# Altium schematic symbol library MCU_Microchip_ATmega.SchLib: 440 symbols (part 1 of 7) (continued)
## ATmega48PV-10A (continued)
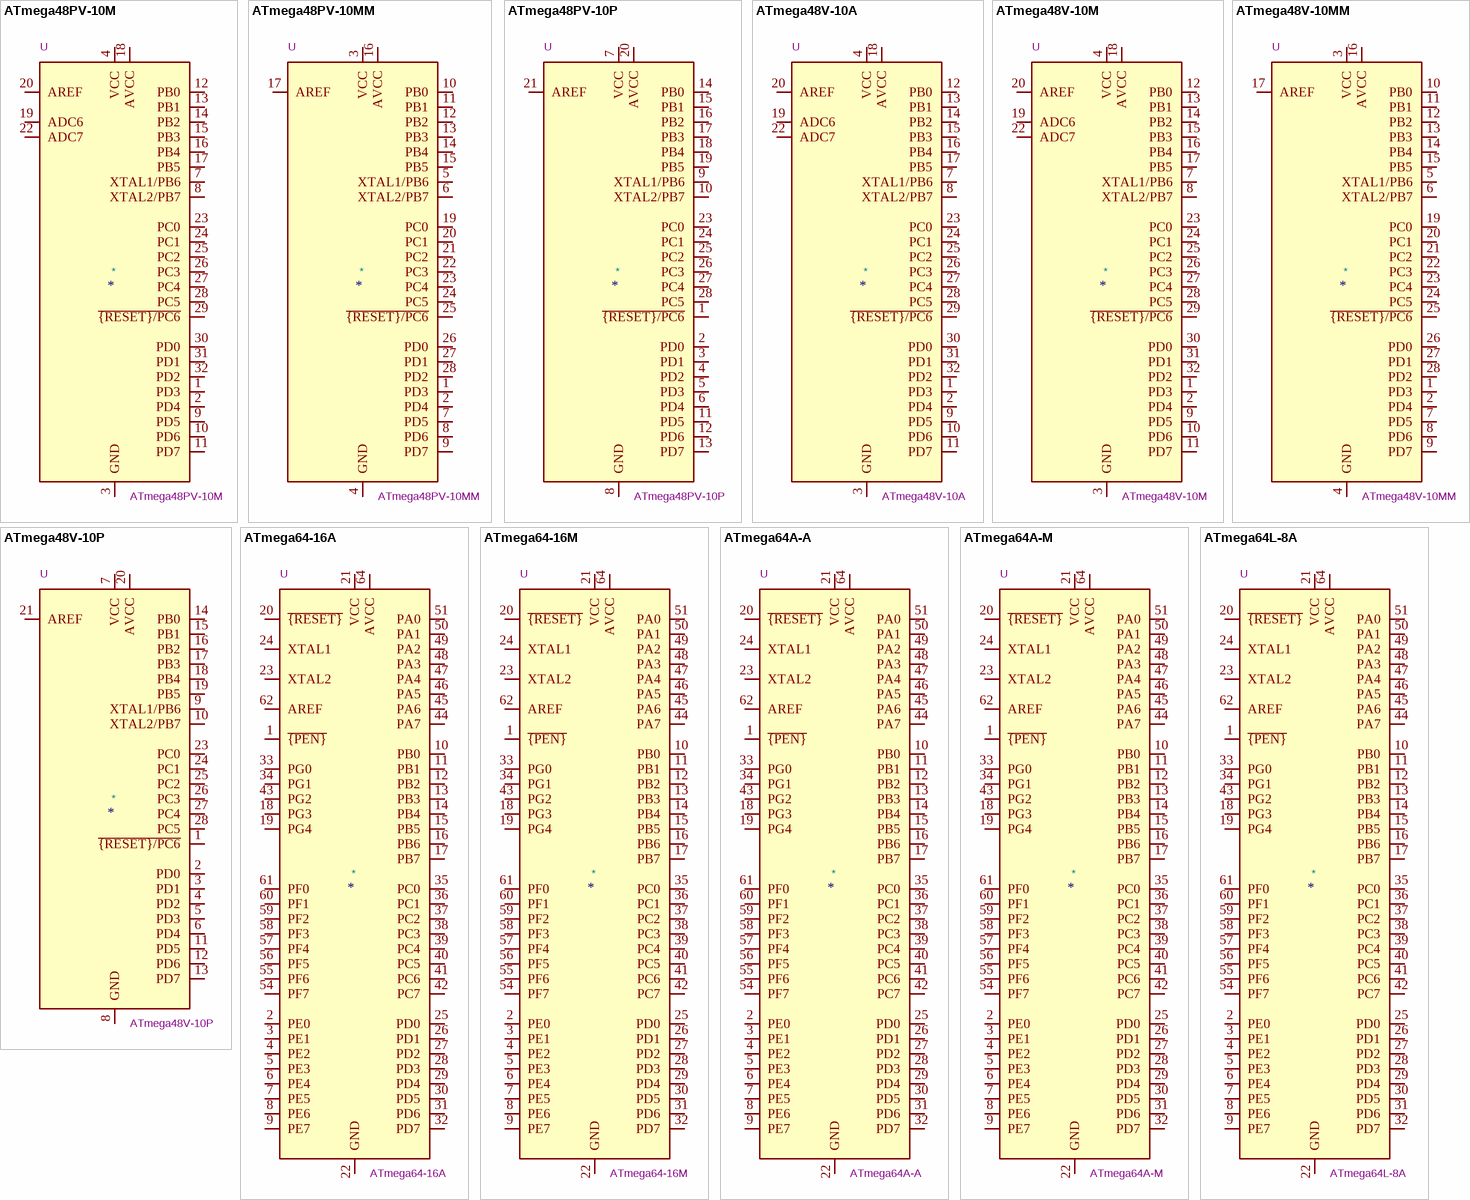
[diagram p5: symbols ATmega48PV-10M to ATmega64L-8A]

## ATmega48PV-10M
designator *  value ATmega48PV-10M  Reference: U
ki_keywords: AVR 8bit Microcontroller MegaAVR; ki_description: 10MHz, 4kB Flash, 512B SRAM, 256B EEPROM, QFN-32; ki_fp_filters: QFN*1EP*5x5mm*P0.5mm*; Footprint: Package_DFN_QFN:QFN-32-1EP_5x5mm_P0.5mm_EP3.1x3.1mm; Datasheet: http://ww1.microchip.com/downloads/en/DeviceDoc/Atmel-8025-8-bit-AVR-Microcontroller-ATmega48P-88P-168P_Datasheet.pdf
pins: 1 PD3, 2 PD4, 3 GND, 4 VCC, 5 GND hidden, 6 VCC hidden, 7 XTAL1/PB6, 8 XTAL2/PB7, 9 PD5, 10 PD6, 11 PD7, 12 PB0, 13 PB1, 14 PB2, 15 PB3, 16 PB4, 17 PB5, 18 AVCC, 19 ADC6, 20 AREF, 21 GND hidden, 22 ADC7, 23 PC0, 24 PC1, 25 PC2, 26 PC3, 27 PC4, 28 PC5, 29 ~{{RESET}/PC6}, 30 PD0, 31 PD1, 32 PD2, 33 GND hidden

## ATmega48PV-10MM
designator *  value ATmega48PV-10MM  Reference: U
ki_keywords: AVR 8bit Microcontroller MegaAVR; ki_description: 10MHz, 4kB Flash, 512B SRAM, 256B EEPROM, QFN-28; ki_fp_filters: QFN*1EP*4x4mm*P0.45mm*; Footprint: Package_DFN_QFN:QFN-28-1EP_4x4mm_P0.45mm_EP2.4x2.4mm; Datasheet: http://ww1.microchip.com/downloads/en/DeviceDoc/Atmel-8025-8-bit-AVR-Microcontroller-ATmega48P-88P-168P_Datasheet.pdf
pins: 1 PD3, 2 PD4, 3 VCC, 4 GND, 5 XTAL1/PB6, 6 XTAL2/PB7, 7 PD5, 8 PD6, 9 PD7, 10 PB0, 11 PB1, 12 PB2, 13 PB3, 14 PB4, 15 PB5, 16 AVCC, 17 AREF, 18 GND hidden, 19 PC0, 20 PC1, 21 PC2, 22 PC3, 23 PC4, 24 PC5, 25 ~{{RESET}/PC6}, 26 PD0, 27 PD1, 28 PD2, 29 GND hidden

## ATmega48PV-10P
designator *  value ATmega48PV-10P  Reference: U
ki_keywords: AVR 8bit Microcontroller MegaAVR; ki_description: 10MHz, 4kB Flash, 512B SRAM, 256B EEPROM, DIP-28; ki_fp_filters: DIP*W7.62mm*; Footprint: Package_DIP:DIP-28_W7.62mm; Datasheet: http://ww1.microchip.com/downloads/en/DeviceDoc/Atmel-8025-8-bit-AVR-Microcontroller-ATmega48P-88P-168P_Datasheet.pdf
pins: 1 ~{{RESET}/PC6}, 2 PD0, 3 PD1, 4 PD2, 5 PD3, 6 PD4, 7 VCC, 8 GND, 9 XTAL1/PB6, 10 XTAL2/PB7, 11 PD5, 12 PD6, 13 PD7, 14 PB0, 15 PB1, 16 PB2, 17 PB3, 18 PB4, 19 PB5, 20 AVCC, 21 AREF, 22 GND hidden, 23 PC0, 24 PC1, 25 PC2, 26 PC3, 27 PC4, 28 PC5

## ATmega48V-10A
designator *  value ATmega48V-10A  Reference: U
ki_keywords: AVR 8bit Microcontroller MegaAVR; ki_description: 10MHz, 4kB Flash, 512B SRAM, 256B EEPROM, TQFP-32; ki_fp_filters: TQFP*7x7mm*P0.8mm*; Footprint: Package_QFP:TQFP-32_7x7mm_P0.8mm; Datasheet: http://ww1.microchip.com/downloads/en/DeviceDoc/Atmel-2545-8-bit-AVR-Microcontroller-ATmega48-88-168_Datasheet.pdf
pins: 1 PD3, 2 PD4, 3 GND, 4 VCC, 5 GND hidden, 6 VCC hidden, 7 XTAL1/PB6, 8 XTAL2/PB7, 9 PD5, 10 PD6, 11 PD7, 12 PB0, 13 PB1, 14 PB2, 15 PB3, 16 PB4, 17 PB5, 18 AVCC, 19 ADC6, 20 AREF, 21 GND hidden, 22 ADC7, 23 PC0, 24 PC1, 25 PC2, 26 PC3, 27 PC4, 28 PC5, 29 ~{{RESET}/PC6}, 30 PD0, 31 PD1, 32 PD2

## ATmega48V-10M
designator *  value ATmega48V-10M  Reference: U
ki_keywords: AVR 8bit Microcontroller MegaAVR; ki_description: 10MHz, 4kB Flash, 512B SRAM, 256B EEPROM, QFN-32; ki_fp_filters: QFN*1EP*5x5mm*P0.5mm*; Footprint: Package_DFN_QFN:QFN-32-1EP_5x5mm_P0.5mm_EP3.1x3.1mm; Datasheet: http://ww1.microchip.com/downloads/en/DeviceDoc/Atmel-2545-8-bit-AVR-Microcontroller-ATmega48-88-168_Datasheet.pdf
pins: 1 PD3, 2 PD4, 3 GND, 4 VCC, 5 GND hidden, 6 VCC hidden, 7 XTAL1/PB6, 8 XTAL2/PB7, 9 PD5, 10 PD6, 11 PD7, 12 PB0, 13 PB1, 14 PB2, 15 PB3, 16 PB4, 17 PB5, 18 AVCC, 19 ADC6, 20 AREF, 21 GND hidden, 22 ADC7, 23 PC0, 24 PC1, 25 PC2, 26 PC3, 27 PC4, 28 PC5, 29 ~{{RESET}/PC6}, 30 PD0, 31 PD1, 32 PD2, 33 GND hidden

## ATmega48V-10MM
designator *  value ATmega48V-10MM  Reference: U
ki_keywords: AVR 8bit Microcontroller MegaAVR; ki_description: 10MHz, 4kB Flash, 512B SRAM, 256B EEPROM, QFN-28; ki_fp_filters: QFN*1EP*4x4mm*P0.45mm*; Footprint: Package_DFN_QFN:QFN-28-1EP_4x4mm_P0.45mm_EP2.4x2.4mm; Datasheet: http://ww1.microchip.com/downloads/en/DeviceDoc/Atmel-2545-8-bit-AVR-Microcontroller-ATmega48-88-168_Datasheet.pdf
pins: 1 PD3, 2 PD4, 3 VCC, 4 GND, 5 XTAL1/PB6, 6 XTAL2/PB7, 7 PD5, 8 PD6, 9 PD7, 10 PB0, 11 PB1, 12 PB2, 13 PB3, 14 PB4, 15 PB5, 16 AVCC, 17 AREF, 18 GND hidden, 19 PC0, 20 PC1, 21 PC2, 22 PC3, 23 PC4, 24 PC5, 25 ~{{RESET}/PC6}, 26 PD0, 27 PD1, 28 PD2, 29 GND hidden

## ATmega48V-10P
designator *  value ATmega48V-10P  Reference: U
ki_keywords: AVR 8bit Microcontroller MegaAVR; ki_description: 10MHz, 4kB Flash, 512B SRAM, 256B EEPROM, DIP-28; ki_fp_filters: DIP*W7.62mm*; Footprint: Package_DIP:DIP-28_W7.62mm; Datasheet: http://ww1.microchip.com/downloads/en/DeviceDoc/Atmel-2545-8-bit-AVR-Microcontroller-ATmega48-88-168_Datasheet.pdf
pins: 1 ~{{RESET}/PC6}, 2 PD0, 3 PD1, 4 PD2, 5 PD3, 6 PD4, 7 VCC, 8 GND, 9 XTAL1/PB6, 10 XTAL2/PB7, 11 PD5, 12 PD6, 13 PD7, 14 PB0, 15 PB1, 16 PB2, 17 PB3, 18 PB4, 19 PB5, 20 AVCC, 21 AREF, 22 GND hidden, 23 PC0, 24 PC1, 25 PC2, 26 PC3, 27 PC4, 28 PC5

## ATmega64-16A
designator *  value ATmega64-16A  Reference: U
ki_keywords: AVR 8bit Microcontroller MegaAVR; ki_description: 16MHz, 64kB Flash, 4kB SRAM, 2kB EEPROM, TQFP-64; ki_fp_filters: TQFP*14x14mm*P0.8mm*; Footprint: Package_QFP:TQFP-64_14x14mm_P0.8mm; Datasheet: http://ww1.microchip.com/downloads/en/DeviceDoc/atmel-2490-8-bit-avr-microcontroller-atmega64-l_datasheet.pdf
pins: 1 ~{{PEN}}, 2 PE0, 3 PE1, 4 PE2, 5 PE3, 6 PE4, 7 PE5, 8 PE6, 9 PE7, 10 PB0, 11 PB1, 12 PB2, 13 PB3, 14 PB4, 15 PB5, 16 PB6, 17 PB7, 18 PG3, 19 PG4, 20 ~{{RESET}}, 21 VCC, 22 GND, 23 XTAL2, 24 XTAL1, 25 PD0, 26 PD1, 27 PD2, 28 PD3, 29 PD4, 30 PD5, 31 PD6, 32 PD7, 33 PG0, 34 PG1, 35 PC0, 36 PC1, 37 PC2, 38 PC3, 39 PC4, 40 PC5, 41 PC6, 42 PC7, 43 PG2, 44 PA7, 45 PA6, 46 PA5, 47 PA4, 48 PA3, 49 PA2, 50 PA1, 51 PA0, 52 VCC hidden, 53 GND hidden, 54 PF7, 55 PF6, 56 PF5, 57 PF4, 58 PF3, 59 PF2, 60 PF1, 61 PF0, 62 AREF, 63 GND hidden, 64 AVCC

## ATmega64-16M
designator *  value ATmega64-16M  Reference: U
ki_keywords: AVR 8bit Microcontroller MegaAVR; ki_description: 16MHz, 64kB Flash, 4kB SRAM, 2kB EEPROM, QFN-64; ki_fp_filters: QFN*1EP*9x9mm*P0.5mm*; Footprint: Package_DFN_QFN:QFN-64-1EP_9x9mm_P0.5mm_EP5.4x5.4mm; Datasheet: http://ww1.microchip.com/downloads/en/DeviceDoc/atmel-2490-8-bit-avr-microcontroller-atmega64-l_datasheet.pdf
pins: 1 ~{{PEN}}, 2 PE0, 3 PE1, 4 PE2, 5 PE3, 6 PE4, 7 PE5, 8 PE6, 9 PE7, 10 PB0, 11 PB1, 12 PB2, 13 PB3, 14 PB4, 15 PB5, 16 PB6, 17 PB7, 18 PG3, 19 PG4, 20 ~{{RESET}}, 21 VCC, 22 GND, 23 XTAL2, 24 XTAL1, 25 PD0, 26 PD1, 27 PD2, 28 PD3, 29 PD4, 30 PD5, 31 PD6, 32 PD7, 33 PG0, 34 PG1, 35 PC0, 36 PC1, 37 PC2, 38 PC3, 39 PC4, 40 PC5, 41 PC6, 42 PC7, 43 PG2, 44 PA7, 45 PA6, 46 PA5, 47 PA4, 48 PA3, 49 PA2, 50 PA1, 51 PA0, 52 VCC hidden, 53 GND hidden, 54 PF7, 55 PF6, 56 PF5, 57 PF4, 58 PF3, 59 PF2, 60 PF1, 61 PF0, 62 AREF, 63 GND hidden, 64 AVCC, 65 GND hidden

## ATmega64A-A
designator *  value ATmega64A-A  Reference: U
ki_keywords: AVR 8bit Microcontroller MegaAVR; ki_description: 16MHz, 64kB Flash, 4kB SRAM, 2kB EEPROM, TQFP-64; ki_fp_filters: TQFP*14x14mm*P0.8mm*; Footprint: Package_QFP:TQFP-64_14x14mm_P0.8mm; Datasheet: http://ww1.microchip.com/downloads/en/DeviceDoc/atmel-8160-8-bit-avr-microcontroller-atmega64a-datasheet.pdf
pins: 1 ~{{PEN}}, 2 PE0, 3 PE1, 4 PE2, 5 PE3, 6 PE4, 7 PE5, 8 PE6, 9 PE7, 10 PB0, 11 PB1, 12 PB2, 13 PB3, 14 PB4, 15 PB5, 16 PB6, 17 PB7, 18 PG3, 19 PG4, 20 ~{{RESET}}, 21 VCC, 22 GND, 23 XTAL2, 24 XTAL1, 25 PD0, 26 PD1, 27 PD2, 28 PD3, 29 PD4, 30 PD5, 31 PD6, 32 PD7, 33 PG0, 34 PG1, 35 PC0, 36 PC1, 37 PC2, 38 PC3, 39 PC4, 40 PC5, 41 PC6, 42 PC7, 43 PG2, 44 PA7, 45 PA6, 46 PA5, 47 PA4, 48 PA3, 49 PA2, 50 PA1, 51 PA0, 52 VCC hidden, 53 GND hidden, 54 PF7, 55 PF6, 56 PF5, 57 PF4, 58 PF3, 59 PF2, 60 PF1, 61 PF0, 62 AREF, 63 GND hidden, 64 AVCC

## ATmega64A-M
designator *  value ATmega64A-M  Reference: U
ki_keywords: AVR 8bit Microcontroller MegaAVR; ki_description: 16MHz, 64kB Flash, 4kB SRAM, 2kB EEPROM, QFN-64; ki_fp_filters: QFN*1EP*9x9mm*P0.5mm*; Footprint: Package_DFN_QFN:QFN-64-1EP_9x9mm_P0.5mm_EP5.4x5.4mm; Datasheet: http://ww1.microchip.com/downloads/en/DeviceDoc/atmel-8160-8-bit-avr-microcontroller-atmega64a-datasheet.pdf
pins: 1 ~{{PEN}}, 2 PE0, 3 PE1, 4 PE2, 5 PE3, 6 PE4, 7 PE5, 8 PE6, 9 PE7, 10 PB0, 11 PB1, 12 PB2, 13 PB3, 14 PB4, 15 PB5, 16 PB6, 17 PB7, 18 PG3, 19 PG4, 20 ~{{RESET}}, 21 VCC, 22 GND, 23 XTAL2, 24 XTAL1, 25 PD0, 26 PD1, 27 PD2, 28 PD3, 29 PD4, 30 PD5, 31 PD6, 32 PD7, 33 PG0, 34 PG1, 35 PC0, 36 PC1, 37 PC2, 38 PC3, 39 PC4, 40 PC5, 41 PC6, 42 PC7, 43 PG2, 44 PA7, 45 PA6, 46 PA5, 47 PA4, 48 PA3, 49 PA2, 50 PA1, 51 PA0, 52 VCC hidden, 53 GND hidden, 54 PF7, 55 PF6, 56 PF5, 57 PF4, 58 PF3, 59 PF2, 60 PF1, 61 PF0, 62 AREF, 63 GND hidden, 64 AVCC, 65 GND hidden

## ATmega64L-8A
designator *  value ATmega64L-8A  Reference: U
ki_keywords: AVR 8bit Microcontroller MegaAVR; ki_description: 8MHz, 64kB Flash, 4kB SRAM, 2kB EEPROM, TQFP-64; ki_fp_filters: TQFP*14x14mm*P0.8mm*; Footprint: Package_QFP:TQFP-64_14x14mm_P0.8mm; Datasheet: http://ww1.microchip.com/downloads/en/DeviceDoc/atmel-2490-8-bit-avr-microcontroller-atmega64-l_datasheet.pdf
pins: 1 ~{{PEN}}, 2 PE0, 3 PE1, 4 PE2, 5 PE3, 6 PE4, 7 PE5, 8 PE6, 9 PE7, 10 PB0, 11 PB1, 12 PB2, 13 PB3, 14 PB4, 15 PB5, 16 PB6, 17 PB7, 18 PG3, 19 PG4, 20 ~{{RESET}}, 21 VCC, 22 GND, 23 XTAL2, 24 XTAL1, 25 PD0, 26 PD1, 27 PD2, 28 PD3, 29 PD4, 30 PD5, 31 PD6, 32 PD7, 33 PG0, 34 PG1, 35 PC0, 36 PC1, 37 PC2, 38 PC3, 39 PC4, 40 PC5, 41 PC6, 42 PC7, 43 PG2, 44 PA7, 45 PA6, 46 PA5, 47 PA4, 48 PA3, 49 PA2, 50 PA1, 51 PA0, 52 VCC hidden, 53 GND hidden, 54 PF7, 55 PF6, 56 PF5, 57 PF4, 58 PF3, 59 PF2, 60 PF1, 61 PF0, 62 AREF, 63 GND hidden, 64 AVCC

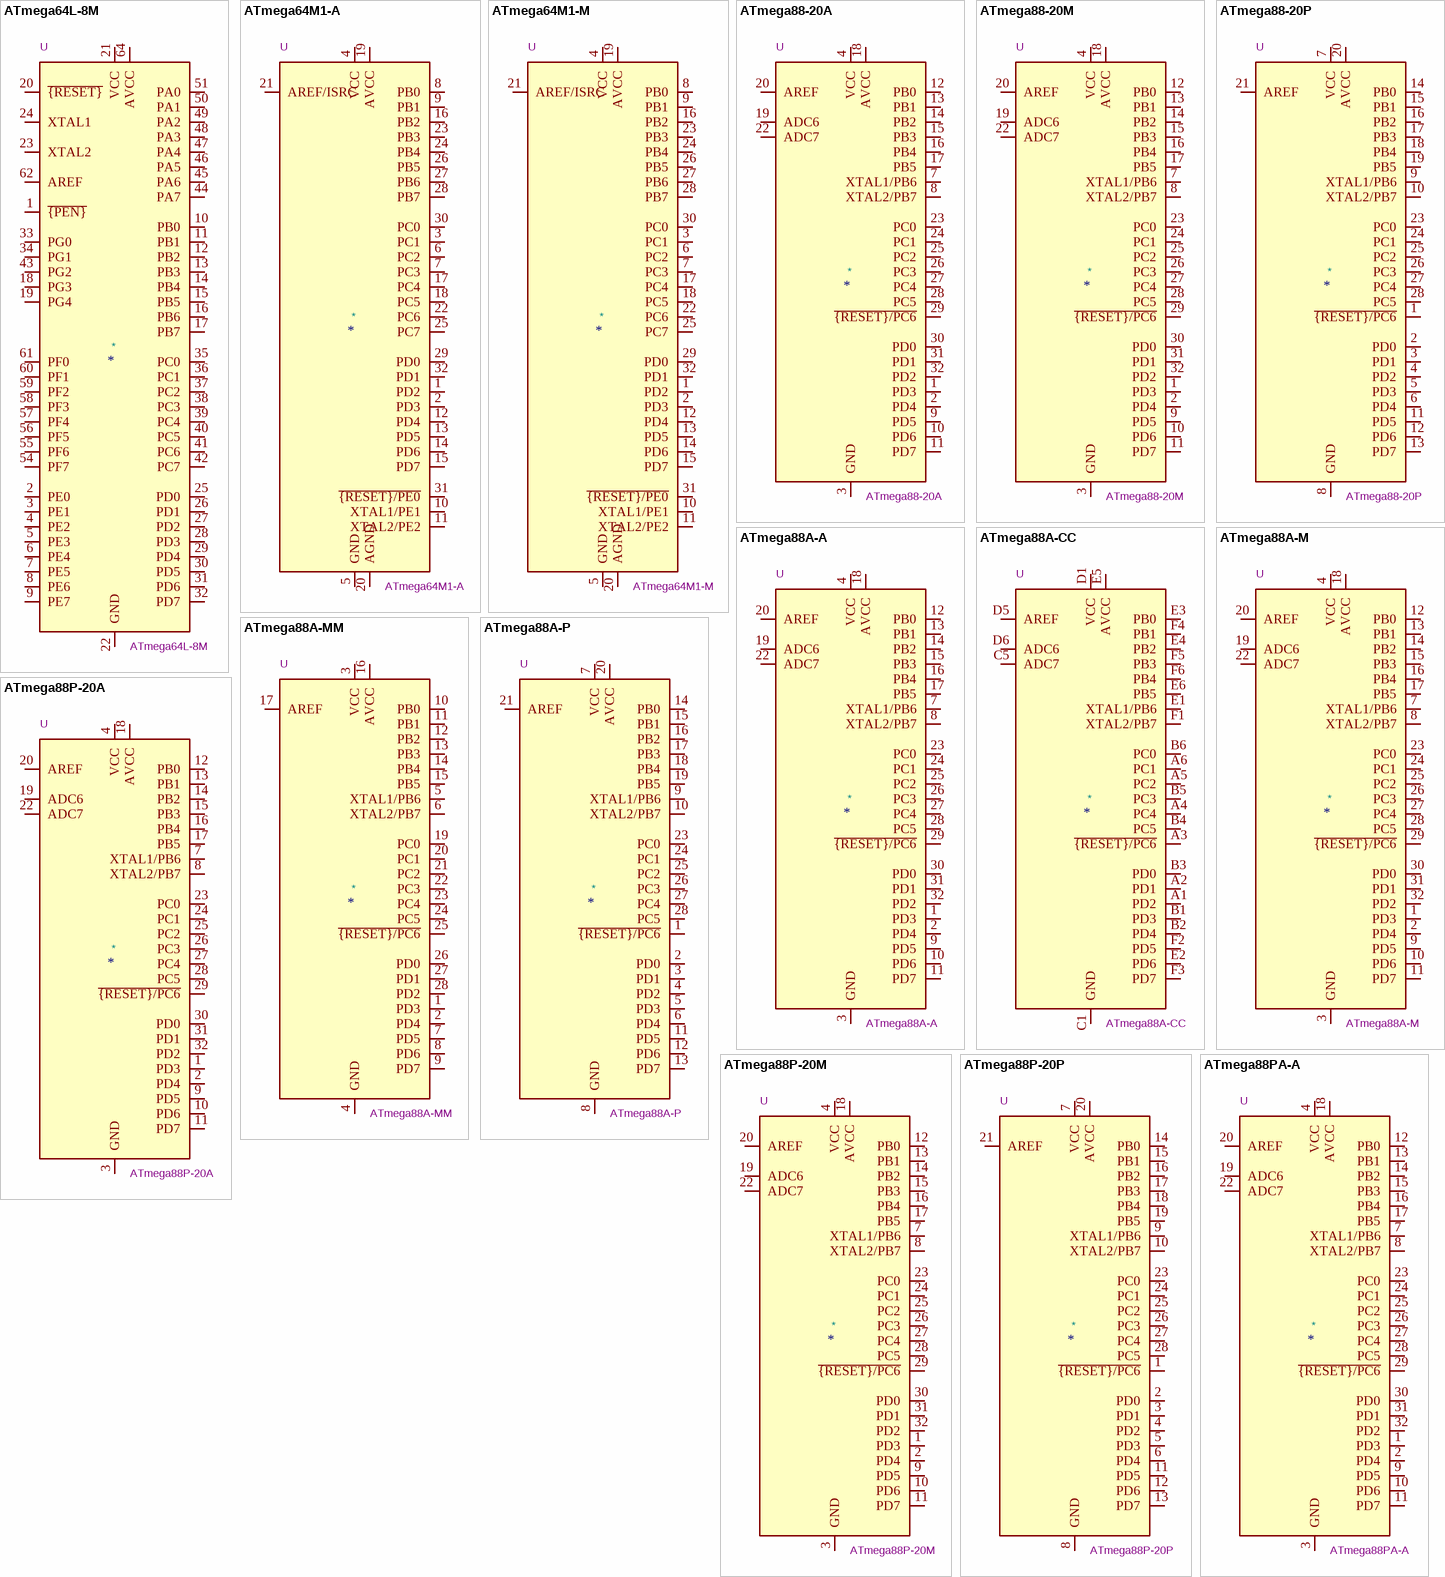
[diagram p6: symbols ATmega64L-8M to ATmega88PA-A]

## ATmega64L-8M
designator *  value ATmega64L-8M  Reference: U
ki_keywords: AVR 8bit Microcontroller MegaAVR; ki_description: 8MHz, 64kB Flash, 4kB SRAM, 2kB EEPROM, QFN-64; ki_fp_filters: QFN*1EP*9x9mm*P0.5mm*; Footprint: Package_DFN_QFN:QFN-64-1EP_9x9mm_P0.5mm_EP5.4x5.4mm; Datasheet: http://ww1.microchip.com/downloads/en/DeviceDoc/atmel-2490-8-bit-avr-microcontroller-atmega64-l_datasheet.pdf
pins: 1 ~{{PEN}}, 2 PE0, 3 PE1, 4 PE2, 5 PE3, 6 PE4, 7 PE5, 8 PE6, 9 PE7, 10 PB0, 11 PB1, 12 PB2, 13 PB3, 14 PB4, 15 PB5, 16 PB6, 17 PB7, 18 PG3, 19 PG4, 20 ~{{RESET}}, 21 VCC, 22 GND, 23 XTAL2, 24 XTAL1, 25 PD0, 26 PD1, 27 PD2, 28 PD3, 29 PD4, 30 PD5, 31 PD6, 32 PD7, 33 PG0, 34 PG1, 35 PC0, 36 PC1, 37 PC2, 38 PC3, 39 PC4, 40 PC5, 41 PC6, 42 PC7, 43 PG2, 44 PA7, 45 PA6, 46 PA5, 47 PA4, 48 PA3, 49 PA2, 50 PA1, 51 PA0, 52 VCC hidden, 53 GND hidden, 54 PF7, 55 PF6, 56 PF5, 57 PF4, 58 PF3, 59 PF2, 60 PF1, 61 PF0, 62 AREF, 63 GND hidden, 64 AVCC, 65 GND hidden

## ATmega64M1-A
designator *  value ATmega64M1-A  Reference: U
ki_keywords: AVR 8bit Microcontroller MegaAVR; ki_description: 16MHz, 64kB Flash, 4kB SRAM, 2kB EEPROM, CAN, TQFP-32; ki_fp_filters: TQFP*7x7mm*P0.8mm*; Footprint: Package_QFP:TQFP-32_7x7mm_P0.8mm; Datasheet: http://ww1.microchip.com/downloads/en/DeviceDoc/Atmel-8209-8-bit%20AVR%20ATmega16M1-32M1-64M1_Datasheet.pdf
pins: 1 PD2, 2 PD3, 3 PC1, 4 VCC, 5 GND, 6 PC2, 7 PC3, 8 PB0, 9 PB1, 10 XTAL1/PE1, 11 XTAL2/PE2, 12 PD4, 13 PD5, 14 PD6, 15 PD7, 16 PB2, 17 PC4, 18 PC5, 19 AVCC, 20 AGND, 21 AREF/ISRC, 22 PC6, 23 PB3, 24 PB4, 25 PC7, 26 PB5, 27 PB6, 28 PB7, 29 PD0, 30 PC0, 31 ~{{RESET}/PE0}, 32 PD1

## ATmega64M1-M
designator *  value ATmega64M1-M  Reference: U
ki_keywords: AVR 8bit Microcontroller MegaAVR; ki_description: 16MHz, 64kB Flash, 4kB SRAM, 2kB EEPROM, CAN, QFN-32; ki_fp_filters: QFN*1EP*7x7mm*P0.65mm*; Footprint: Package_DFN_QFN:QFN-32-1EP_7x7mm_P0.65mm_EP4.65x4.65mm; Datasheet: http://ww1.microchip.com/downloads/en/DeviceDoc/Atmel-8209-8-bit%20AVR%20ATmega16M1-32M1-64M1_Datasheet.pdf
pins: 1 PD2, 2 PD3, 3 PC1, 4 VCC, 5 GND, 6 PC2, 7 PC3, 8 PB0, 9 PB1, 10 XTAL1/PE1, 11 XTAL2/PE2, 12 PD4, 13 PD5, 14 PD6, 15 PD7, 16 PB2, 17 PC4, 18 PC5, 19 AVCC, 20 AGND, 21 AREF/ISRC, 22 PC6, 23 PB3, 24 PB4, 25 PC7, 26 PB5, 27 PB6, 28 PB7, 29 PD0, 30 PC0, 31 ~{{RESET}/PE0}, 32 PD1, 33 GND hidden

## ATmega88-20A
designator *  value ATmega88-20A  Reference: U
ki_keywords: AVR 8bit Microcontroller MegaAVR; ki_description: 20MHz, 8kB Flash, 1kB SRAM, 512B EEPROM, TQFP-32; ki_fp_filters: TQFP*7x7mm*P0.8mm*; Footprint: Package_QFP:TQFP-32_7x7mm_P0.8mm; Datasheet: http://ww1.microchip.com/downloads/en/DeviceDoc/Atmel-2545-8-bit-AVR-Microcontroller-ATmega48-88-168_Datasheet.pdf
pins: 1 PD3, 2 PD4, 3 GND, 4 VCC, 5 GND hidden, 6 VCC hidden, 7 XTAL1/PB6, 8 XTAL2/PB7, 9 PD5, 10 PD6, 11 PD7, 12 PB0, 13 PB1, 14 PB2, 15 PB3, 16 PB4, 17 PB5, 18 AVCC, 19 ADC6, 20 AREF, 21 GND hidden, 22 ADC7, 23 PC0, 24 PC1, 25 PC2, 26 PC3, 27 PC4, 28 PC5, 29 ~{{RESET}/PC6}, 30 PD0, 31 PD1, 32 PD2

## ATmega88-20M
designator *  value ATmega88-20M  Reference: U
ki_keywords: AVR 8bit Microcontroller MegaAVR; ki_description: 20MHz, 8kB Flash, 1kB SRAM, 512B EEPROM, QFN-32; ki_fp_filters: QFN*1EP*5x5mm*P0.5mm*; Footprint: Package_DFN_QFN:QFN-32-1EP_5x5mm_P0.5mm_EP3.1x3.1mm; Datasheet: http://ww1.microchip.com/downloads/en/DeviceDoc/Atmel-2545-8-bit-AVR-Microcontroller-ATmega48-88-168_Datasheet.pdf
pins: 1 PD3, 2 PD4, 3 GND, 4 VCC, 5 GND hidden, 6 VCC hidden, 7 XTAL1/PB6, 8 XTAL2/PB7, 9 PD5, 10 PD6, 11 PD7, 12 PB0, 13 PB1, 14 PB2, 15 PB3, 16 PB4, 17 PB5, 18 AVCC, 19 ADC6, 20 AREF, 21 GND hidden, 22 ADC7, 23 PC0, 24 PC1, 25 PC2, 26 PC3, 27 PC4, 28 PC5, 29 ~{{RESET}/PC6}, 30 PD0, 31 PD1, 32 PD2, 33 GND hidden

## ATmega88-20P
designator *  value ATmega88-20P  Reference: U
ki_keywords: AVR 8bit Microcontroller MegaAVR; ki_description: 20MHz, 8kB Flash, 1kB SRAM, 512B EEPROM, DIP-28; ki_fp_filters: DIP*W7.62mm*; Footprint: Package_DIP:DIP-28_W7.62mm; Datasheet: http://ww1.microchip.com/downloads/en/DeviceDoc/Atmel-2545-8-bit-AVR-Microcontroller-ATmega48-88-168_Datasheet.pdf
pins: 1 ~{{RESET}/PC6}, 2 PD0, 3 PD1, 4 PD2, 5 PD3, 6 PD4, 7 VCC, 8 GND, 9 XTAL1/PB6, 10 XTAL2/PB7, 11 PD5, 12 PD6, 13 PD7, 14 PB0, 15 PB1, 16 PB2, 17 PB3, 18 PB4, 19 PB5, 20 AVCC, 21 AREF, 22 GND hidden, 23 PC0, 24 PC1, 25 PC2, 26 PC3, 27 PC4, 28 PC5

## ATmega88A-A
designator *  value ATmega88A-A  Reference: U
ki_keywords: AVR 8bit Microcontroller MegaAVR; ki_description: 20MHz, 8kB Flash, 1kB SRAM, 512B EEPROM, TQFP-32; ki_fp_filters: TQFP*7x7mm*P0.8mm*; Footprint: Package_QFP:TQFP-32_7x7mm_P0.8mm; Datasheet: http://ww1.microchip.com/downloads/en/DeviceDoc/ATmega48A_88A_168A-Data-Sheet-40002007A.pdf
pins: 1 PD3, 2 PD4, 3 GND, 4 VCC, 5 GND hidden, 6 VCC hidden, 7 XTAL1/PB6, 8 XTAL2/PB7, 9 PD5, 10 PD6, 11 PD7, 12 PB0, 13 PB1, 14 PB2, 15 PB3, 16 PB4, 17 PB5, 18 AVCC, 19 ADC6, 20 AREF, 21 GND hidden, 22 ADC7, 23 PC0, 24 PC1, 25 PC2, 26 PC3, 27 PC4, 28 PC5, 29 ~{{RESET}/PC6}, 30 PD0, 31 PD1, 32 PD2

## ATmega88A-CC
designator *  value ATmega88A-CC  Reference: U
ki_keywords: AVR 8bit Microcontroller MegaAVR; ki_description: 20MHz, 8kB Flash, 1kB SRAM, 512B EEPROM, UFBGA-32; ki_fp_filters: UFBGA*4.0x4.0mm*Layout6x6*P0.5mm*; Footprint: Package_BGA:UFBGA-32_4.0x4.0mm_Layout6x6_P0.5mm; Datasheet: http://ww1.microchip.com/downloads/en/DeviceDoc/ATmega48A_88A_168A-Data-Sheet-40002007A.pdf
pins: A1 PD2, A2 PD1, A3 ~{{RESET}/PC6}, A4 PC4, A5 PC2, A6 PC1, B1 PD3, B2 PD4, B3 PD0, B4 PC5, B5 PC3, B6 PC0, C1 GND, C2 GND hidden, C5 ADC7, C6 GND hidden, D1 VCC, D2 VCC hidden, D5 AREF, D6 ADC6, E1 XTAL1/PB6, E2 PD6, E3 PB0, E4 PB2, E5 AVCC, E6 PB5, F1 XTAL2/PB7, F2 PD5, F3 PD7, F4 PB1, F5 PB3, F6 PB4

## ATmega88A-M
designator *  value ATmega88A-M  Reference: U
ki_keywords: AVR 8bit Microcontroller MegaAVR; ki_description: 20MHz, 8kB Flash, 1kB SRAM, 512B EEPROM, QFN-32; ki_fp_filters: QFN*1EP*5x5mm*P0.5mm*; Footprint: Package_DFN_QFN:QFN-32-1EP_5x5mm_P0.5mm_EP3.1x3.1mm; Datasheet: http://ww1.microchip.com/downloads/en/DeviceDoc/ATmega48A_88A_168A-Data-Sheet-40002007A.pdf
pins: 1 PD3, 2 PD4, 3 GND, 4 VCC, 5 GND hidden, 6 VCC hidden, 7 XTAL1/PB6, 8 XTAL2/PB7, 9 PD5, 10 PD6, 11 PD7, 12 PB0, 13 PB1, 14 PB2, 15 PB3, 16 PB4, 17 PB5, 18 AVCC, 19 ADC6, 20 AREF, 21 GND hidden, 22 ADC7, 23 PC0, 24 PC1, 25 PC2, 26 PC3, 27 PC4, 28 PC5, 29 ~{{RESET}/PC6}, 30 PD0, 31 PD1, 32 PD2, 33 GND hidden

## ATmega88A-MM
designator *  value ATmega88A-MM  Reference: U
ki_keywords: AVR 8bit Microcontroller MegaAVR; ki_description: 20MHz, 8kB Flash, 1kB SRAM, 512B EEPROM, QFN-28; ki_fp_filters: QFN*1EP*4x4mm*P0.45mm*; Footprint: Package_DFN_QFN:QFN-28-1EP_4x4mm_P0.45mm_EP2.4x2.4mm; Datasheet: http://ww1.microchip.com/downloads/en/DeviceDoc/ATmega48A_88A_168A-Data-Sheet-40002007A.pdf
pins: 1 PD3, 2 PD4, 3 VCC, 4 GND, 5 XTAL1/PB6, 6 XTAL2/PB7, 7 PD5, 8 PD6, 9 PD7, 10 PB0, 11 PB1, 12 PB2, 13 PB3, 14 PB4, 15 PB5, 16 AVCC, 17 AREF, 18 GND hidden, 19 PC0, 20 PC1, 21 PC2, 22 PC3, 23 PC4, 24 PC5, 25 ~{{RESET}/PC6}, 26 PD0, 27 PD1, 28 PD2, 29 GND hidden

## ATmega88A-P
designator *  value ATmega88A-P  Reference: U
ki_keywords: AVR 8bit Microcontroller MegaAVR; ki_description: 20MHz, 8kB Flash, 1kB SRAM, 512B EEPROM, DIP-28; ki_fp_filters: DIP*W7.62mm*; Footprint: Package_DIP:DIP-28_W7.62mm; Datasheet: http://ww1.microchip.com/downloads/en/DeviceDoc/ATmega48A_88A_168A-Data-Sheet-40002007A.pdf
pins: 1 ~{{RESET}/PC6}, 2 PD0, 3 PD1, 4 PD2, 5 PD3, 6 PD4, 7 VCC, 8 GND, 9 XTAL1/PB6, 10 XTAL2/PB7, 11 PD5, 12 PD6, 13 PD7, 14 PB0, 15 PB1, 16 PB2, 17 PB3, 18 PB4, 19 PB5, 20 AVCC, 21 AREF, 22 GND hidden, 23 PC0, 24 PC1, 25 PC2, 26 PC3, 27 PC4, 28 PC5